# Altium footprint library NDLib.PCBLIB: 499 footprints (part 18 of 32)
Each footprint in its own frame and in the unit in brackets; x right, y up, seen from the top. Pads: shape width x height; smd on the part's side, far side on the other; paste and mask are expansions set on the pad; w line width, h text height; cw(c..) or ccw(c..) is an arc to the next point about the centre after c.
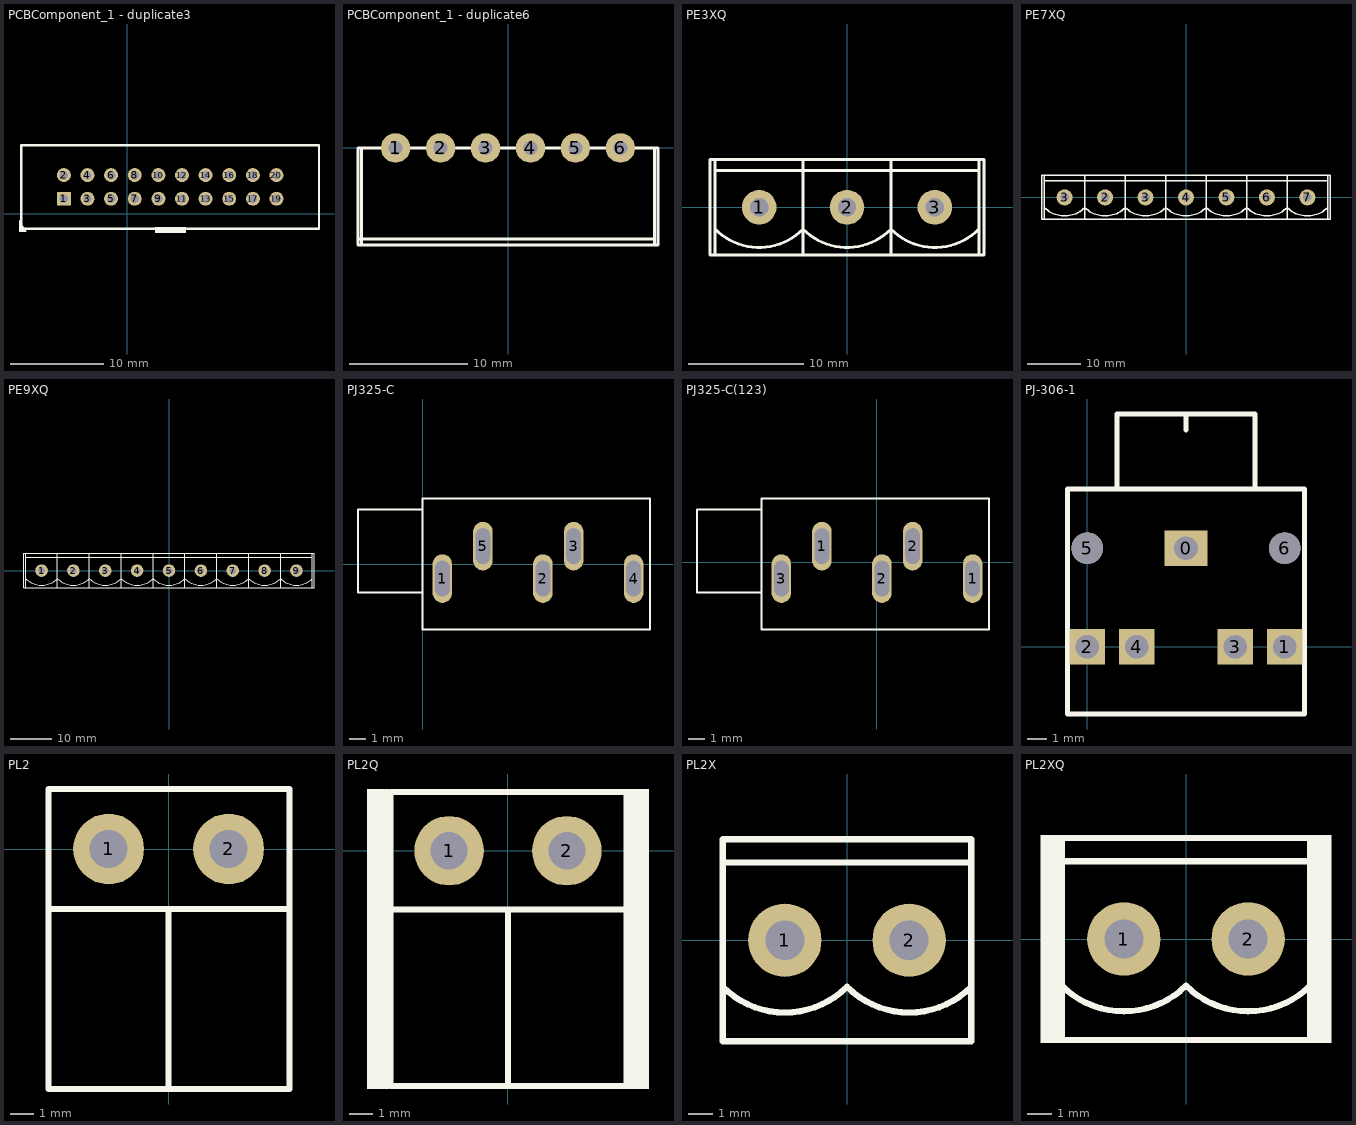
[diagram p17: the footprints below, top view; thin cyan lines are the x and y axes]

## PCBComponent_1 - duplicate1 [mm]

## PCBComponent_1 - duplicate2 [mm]

## PCBComponent_1 - duplicate3 [mm]
pads (20):
  rect 1.5x1.5 hole 0.9: 1(-6.812,1.629)
  round 1.5 hole 0.9: 2(-6.812,4.169) 3(-4.272,1.629) 4(-4.272,4.169) 5(-1.732,1.629) 6(-1.732,4.169) 7(0.808,1.629) 8(0.808,4.169) 9(3.348,1.629) 10(3.348,4.169) 11(5.888,1.629) 12(5.888,4.169) 13(8.428,1.629) 14(8.428,4.169) 15(10.968,1.629) 16(10.968,4.169) 17(13.508,1.629) 18(13.508,4.169) 19(16.048,1.629) 20(16.048,4.169)
TopOverlay:
  rectangle: 2.967,-2.043 6.342,-1.393
  region: -11.631,-0.676 -11.631,-1.901 -10.831,-1.901 -10.831,-1.876
  lines w0.254: -11.382,-1.601 -11.382,7.399 20.618,7.399 20.618,-1.601 -11.382,-1.601

## PCBComponent_1 - duplicate4 [mm]

## PCBComponent_1 - duplicate5 [mm]

## PCBComponent_1 - duplicate6 [mm]
pads (6):
  round 2.5 hole 1.2: 1(-9.525,0) 2(-5.715,0) 3(-1.905,0) 4(1.905,0) 5(5.715,0) 6(9.525,0)
TopOverlay:
  lines w0.254: -12.705,-7.692 12.405,-7.692 ; -12.705,-8.2 12.405,-8.2 ; -12.705,-8.2 -12.405,-8.2 -12.405,0 -12.705,0 ; -12.705,-8.2 -12.705,0 ; -12.705,0 0,0 12.705,0 ; 12.405,-8.2 12.705,-8.2 12.705,0 ; 12.405,-8.2 12.405,0 12.705,0

## PE3XQ [mm]
pads (3):
  round 3 hole 1.6: 1(-7.62,0) 2(0,0) 3(7.62,0)
TopOverlay:
  lines w0.254: -11.43,-1.905 ccw(c-7.62,1.905) -3.81,-1.905 ccw(c0,1.905) 3.81,-1.905 ccw(c7.62,1.905) 11.43,-1.905 ; -11.43,3.175 11.43,3.175 ; -3.81,-4.127 -3.81,4.127 ; 3.81,-4.127 3.81,4.127 ; -11.43,-4.127 -11.898,-4.127 -11.898,4.127 -11.43,4.127 ; -11.43,-4.127 2.54,-4.127 11.43,-4.127 ; -11.43,-4.127 -11.43,4.127 ; -11.43,4.127 2.54,4.127 11.43,4.127 ; 11.43,-4.127 11.898,-4.127 11.898,4.127 11.43,4.127 ; 11.43,-4.127 11.43,4.127

## PE7XQ [mm]
pads (7):
  round 3 hole 1.6: 2(-15.24,0) 3(-22.86,0) 3(-7.62,0) 4(0,0) 5(7.62,0) 6(15.24,0) 7(22.86,0)
TopOverlay:
  lines w0.254: -26.67,-1.905 ccw(c-22.86,1.905) -19.05,-1.905 ccw(c-15.24,1.905) -11.43,-1.905 ccw(c-7.62,1.905) -3.81,-1.905 ccw(c0,1.905) 3.81,-1.905 ccw(c7.62,1.905) 11.43,-1.905 ccw(c15.24,1.905) 19.05,-1.905 ccw(c22.86,1.905) 26.67,-1.905 ; -26.67,3.175 -3.81,3.175 19.05,3.175 26.642,3.175 ; -19.05,-4.127 -19.05,4.127 ; -11.43,-4.127 -11.43,4.127 ; -5.08,-4.127 3.81,-4.127 ; -5.08,4.127 3.81,4.127 ; 2.54,-4.127 11.43,-4.127 ; 2.54,4.127 11.43,4.127 ; 10.16,-4.127 19.05,-4.127 ; 10.16,4.127 19.05,4.127 ; 17.78,-4.127 26.67,-4.127 ; 17.78,4.127 26.67,4.127 ; -26.67,-4.127 -26.67,4.127 ; -26.67,-4.127 -12.7,-4.127 -3.81,-4.127 ; -26.67,-4.127 -27.138,-4.127 -27.138,4.127 -26.67,4.127 ; -26.67,4.127 -12.7,4.127 -3.81,4.127 ; -3.81,-4.127 -3.81,4.127 ; -3.81,-4.127 -3.81,4.127 ; 3.81,-4.127 3.81,4.127 ; 3.81,-4.127 3.81,4.127 ; 11.43,-4.127 11.43,4.127 ; 11.43,-4.127 11.43,4.127 ; 19.05,-4.127 19.05,4.127 ; 19.05,-4.127 19.05,4.127 ; 26.67,-4.127 27.138,-4.127 27.138,4.127 26.67,4.127 ; 26.67,-4.127 26.67,4.127

## PE9XQ [mm]
pads (9):
  round 3 hole 1.6: 1(-30.48,0) 2(-22.86,0) 3(-15.24,0) 4(-7.62,0) 5(0,0) 6(7.62,0) 7(15.24,0) 8(22.86,0) 9(30.48,0)
TopOverlay:
  lines w0.254: -34.29,-1.905 ccw(c-30.48,1.905) -26.67,-1.905 ccw(c-22.86,1.905) -19.05,-1.905 ccw(c-15.24,1.905) -11.43,-1.905 ccw(c-7.62,1.905) -3.81,-1.905 ccw(c0,1.905) 3.81,-1.905 ccw(c7.62,1.905) 11.43,-1.905 ccw(c15.24,1.905) 19.05,-1.905 ccw(c22.86,1.905) 26.67,-1.905 ccw(c30.48,1.905) 34.29,-1.905 ; -34.29,3.175 -11.43,3.175 11.43,3.175 19.022,3.175 ; -26.67,-4.127 -26.67,4.127 ; -19.05,-4.127 -19.05,4.127 ; -12.7,-4.127 -3.81,-4.127 ; -12.7,4.127 -3.81,4.127 ; -5.08,-4.127 3.81,-4.127 ; -5.08,4.127 3.81,4.127 ; 2.54,-4.127 11.43,-4.127 ; 2.54,4.127 11.43,4.127 ; 10.16,-4.127 19.05,-4.127 19.05,4.127 10.16,4.127 ; 17.78,-4.127 26.67,-4.127 ; 17.78,4.127 26.67,4.127 ; 19.05,3.175 26.642,3.175 ; 26.67,3.175 34.262,3.175 ; -34.29,-4.127 -34.29,4.127 ; -34.29,-4.127 -20.32,-4.127 -11.43,-4.127 ; -34.29,-4.127 -34.758,-4.127 -34.758,4.127 -34.29,4.127 ; -34.29,4.127 -20.32,4.127 -11.43,4.127 ; -11.43,-4.127 -11.43,4.127 ; -11.43,-4.127 -11.43,4.127 ; -3.81,-4.127 -3.81,4.127 ; -3.81,-4.127 -3.81,4.127 ; 3.81,-4.127 3.81,4.127 ; 3.81,-4.127 3.81,4.127 ; 11.43,-4.127 11.43,4.127 ; 11.43,-4.127 11.43,4.127 ; 26.67,-4.127 26.67,4.127 ; 26.67,-4.127 26.67,4.127 ; 26.67,-4.127 26.67,4.127 ; 26.67,-4.127 26.67,4.127 ; 26.67,-4.127 26.67,4.127 ; 26.67,-4.127 34.29,-4.127 ; 26.67,4.127 34.29,4.127 ; 34.29,-4.127 34.29,4.127 ; 34.29,-4.127 34.758,-4.127 34.758,4.127 34.29,4.127

## PJ325-C [mm]
height 12.3
pads (5):
  oval 1.2x3 hole 0.9 slot 2.2 at 90 deg: 1(1.2,-0.9) 2(7.4,-0.9) 3(9.3,1.1) 4(13,-0.9) 5(3.7,1.1)
TopOverlay:
  lines w0.127: -0.035,-1.75 -4,-1.75 -4,3.35 -0.035,3.35 ; -0.035,-4.05 -0.035,4.05 14,4.05 14,-4.05 -0.035,-4.05

## PJ325-C(123) [mm]
height 12.3
pads (5):
  oval 1.2x3 hole 0.9 slot 2.2 at 90 deg: 1(-3.4,1) 1(5.9,-1) 2(0.3,-1) 2(2.2,1) 3(-5.9,-1)
TopOverlay:
  lines w0.127: -7.135,-1.85 -11.1,-1.85 -11.1,3.25 -7.135,3.25 ; -7.135,-4.15 6.9,-4.15 6.9,3.95 -7.135,3.95 -7.135,-4.15

## PJ-306-1 [mm]
pads (7):
  rect 2.2x1.8 hole 1.2: 0(5,5)
  rect 1.8x1.8 hole 1.2: 1(10,0) 2(0,0) 3(7.5,0) 4(2.5,0)
  round 1.6 hole 1.6 unplated: 5(0,5) 6(10,5)
TopOverlay:
  lines w0.254: 1.5,8 1.5,11.8 8.4,11.8 ; 5,11 5,11.8 ; 8.5,8 8.5,11.8 ; -1,-3.4 11,-3.4 11,8 -1,8 -1,-3.4
3D body: height 3.2, standoff -10.8, extent -1.041,-3.689 11.059,11.411

## PL2 [mm]
pads (2):
  round 3 hole 1.6: 1(-2.54,0) 2(2.54,0)
TopOverlay:
  lines w0.254: 0,-10.16 0,-2.54 ; 5.113,-5.08 5.113,2.54 -5.08,2.54 -5.08,-10.16 ; -5.08,-10.16 -5.08,-2.54 5.113,-2.54 5.113,-10.16 -5.08,-10.16

## PL2Q [mm]
pads (2):
  round 3 hole 1.6: 1(-2.54,0) 2(2.54,0)
TopOverlay:
  region: -5.131,2.667 -6.096,2.667 -6.096,-10.287 -5.131,-10.287
  rectangle: 5.131,-10.287 6.096,2.667
  lines w0.254: 0,-10.16 0,-2.54 ; 5.113,-5.08 5.113,2.54 -5.08,2.54 -5.08,-10.16 ; -5.08,-10.16 5.113,-10.16 5.113,-2.54 -5.08,-2.54 -5.08,-10.16

## PL2X [mm]
pads (2):
  round 3 hole 1.6: 1(-2.54,0) 2(2.54,0)
TopOverlay:
  lines w0.254: -5.08,-1.905 ccw(c-2.54,0.635) 0,-1.905 ccw(c2.54,0.635) 5.08,-1.905 ; -5.08,3.175 5.08,3.175 ; -5.08,-4.127 5.08,-4.127 5.08,4.127 -5.08,4.127 -5.08,-4.127

## PL2XQ [mm]
pads (2):
  round 3 hole 1.6: 1(-2.54,0) 2(2.54,0)
TopOverlay:
  rectangle: 5.08,-4.255 5.95,4.255
  region: -5.08,4.255 -5.95,4.255 -5.95,-4.255 -5.08,-4.255
  lines w0.254: -5.08,-1.905 ccw(c-2.54,0.635) 0,-1.905 ccw(c2.54,0.635) 5.08,-1.905 ; -5.08,3.175 5.08,3.175 ; -5.08,-4.127 -5.08,4.127 5.08,4.127 5.08,-4.127 -5.08,-4.127